# Altium footprint library Connector_PinHeader_1.27mm.PcbLib: 278 footprints (part 5 of 18) (continued)
## PinHeader_1x19_P1.27mm_Horizontal [mm] (continued)
  text "'.Designator'" at 1.504,-13.858 h0.6

## PinHeader_1x19_P1.27mm_Vertical [mm]
pads (19):
  rect 1x1 hole 0.65: 1(0,0)
  rrect100% 1x1 hole 0.65: 2(0,-1.27) 3(0,-2.54) 4(0,-3.81) 5(0,-5.08) 6(0,-6.35) 7(0,-7.62) 8(0,-8.89) 9(0,-10.16) 10(0,-11.43) 11(0,-12.7) 12(0,-13.97) 13(0,-15.24) 14(0,-16.51) 15(0,-17.78) 16(0,-19.05) 17(0,-20.32) 18(0,-21.59) 19(0,-22.86)
F.SilkS:
  lines w0.12: -1.11,0 -1.11,0.76 0,0.76 ; -0.563,-0.76 -1.11,-0.76 -1.11,-23.555 -0.308,-23.555 ; 0.308,-23.555 1.11,-23.555 1.11,-0.76 0.563,-0.76
F.CrtYd:
  lines w0.05: -1.55,-24 -1.55,1.15 1.55,1.15 1.55,-24 -1.55,-24
F.Fab:
  lines w0.1: -1.05,-23.495 -1.05,0.11 -0.525,0.635 1.05,0.635 1.05,-23.495 -1.05,-23.495
  text "'.Designator'" at 0.84,-15.477 h1

## PinHeader_1x19_P1.27mm_Vertical_SMD_Pin1Left [mm]
pads (19):
  rect 3x0.65 smd: 1(-1.5,11.43) 2(1.5,10.16) 3(-1.5,8.89) 4(1.5,7.62) 5(-1.5,6.35) 6(1.5,5.08) 7(-1.5,3.81) 8(1.5,2.54) 9(-1.5,1.27) 10(1.5,0) 11(-1.5,-1.27) 12(1.5,-2.54) 13(-1.5,-3.81) 14(1.5,-5.08) 15(-1.5,-6.35) 16(1.5,-7.62) 17(-1.5,-8.89) 18(1.5,-10.16) 19(-1.5,-11.43)
F.SilkS:
  lines w0.12: -2.94,12.015 -1.11,12.015 -1.11,12.125 1.11,12.125 ; -1.11,-12.125 1.11,-12.125 1.11,-12.015 ; -1.11,-10.845 -1.11,-9.475 ; -1.11,-8.305 -1.11,-6.935 ; -1.11,-5.765 -1.11,-4.395 ; -1.11,-3.225 -1.11,-1.855 ; -1.11,-0.685 -1.11,0.685 ; -1.11,1.855 -1.11,3.225 ; -1.11,4.395 -1.11,5.765 ; -1.11,6.935 -1.11,8.305 ; -1.11,9.475 -1.11,10.845 ; 1.11,-12.115 1.11,-10.745 ; 1.11,-9.575 1.11,-8.205 ; 1.11,-7.035 1.11,-5.665 ; 1.11,-4.495 1.11,-3.125 ; 1.11,-1.955 1.11,-0.585 ; 1.11,0.585 1.11,1.955 ; 1.11,3.125 1.11,4.495 ; 1.11,5.665 1.11,7.035 ; 1.11,8.205 1.11,9.575 ; 1.11,10.745 1.11,12.115
F.CrtYd:
  lines w0.05: -3.5,-12.6 3.5,-12.6 3.5,12.6 -3.5,12.6 -3.5,-12.6
F.Fab:
  lines w0.1: -1.05,-11.63 -2.5,-11.63 -2.5,-11.23 -1.05,-11.23 ; -1.05,-9.09 -2.5,-9.09 -2.5,-8.69 -1.05,-8.69 ; -1.05,-6.55 -2.5,-6.55 -2.5,-6.15 -1.05,-6.15 ; -1.05,-4.01 -2.5,-4.01 -2.5,-3.61 -1.05,-3.61 ; -1.05,-1.47 -2.5,-1.47 -2.5,-1.07 -1.05,-1.07 ; -1.05,1.07 -2.5,1.07 -2.5,1.47 -1.05,1.47 ; -1.05,3.61 -2.5,3.61 -2.5,4.01 -1.05,4.01 ; -1.05,6.15 -2.5,6.15 -2.5,6.55 -1.05,6.55 ; -1.05,8.69 -2.5,8.69 -2.5,9.09 -1.05,9.09 ; -1.05,11.23 -2.5,11.23 -2.5,11.63 -1.05,11.63 ; 1.05,-10.36 2.5,-10.36 2.5,-9.96 1.05,-9.96 ; 1.05,-7.82 2.5,-7.82 2.5,-7.42 1.05,-7.42 ; 1.05,-5.28 2.5,-5.28 2.5,-4.88 1.05,-4.88 ; 1.05,-2.74 2.5,-2.74 2.5,-2.34 1.05,-2.34 ; 1.05,-0.2 2.5,-0.2 2.5,0.2 1.05,0.2 ; 1.05,2.34 2.5,2.34 2.5,2.74 1.05,2.74 ; 1.05,4.88 2.5,4.88 2.5,5.28 1.05,5.28 ; 1.05,7.42 2.5,7.42 2.5,7.82 1.05,7.82 ; 1.05,9.96 2.5,9.96 2.5,10.36 1.05,10.36 ; -1.05,11.63 -0.615,12.065 1.05,12.065 1.05,-12.065 -1.05,-12.065 -1.05,11.63
  text "'.Designator'" at 0.84,-4.047 h1

## PinHeader_1x19_P1.27mm_Vertical_SMD_Pin1Right [mm]
pads (19):
  rect 3x0.65 smd: 1(1.5,11.43) 2(-1.5,10.16) 3(1.5,8.89) 4(-1.5,7.62) 5(1.5,6.35) 6(-1.5,5.08) 7(1.5,3.81) 8(-1.5,2.54) 9(1.5,1.27) 10(-1.5,0) 11(1.5,-1.27) 12(-1.5,-2.54) 13(1.5,-3.81) 14(-1.5,-5.08) 15(1.5,-6.35) 16(-1.5,-7.62) 17(1.5,-8.89) 18(-1.5,-10.16) 19(1.5,-11.43)
F.SilkS:
  lines w0.12: -1.11,-12.115 -1.11,-10.745 ; -1.11,-12.015 -1.11,-12.125 1.11,-12.125 ; -1.11,-9.575 -1.11,-8.205 ; -1.11,-7.035 -1.11,-5.665 ; -1.11,-4.495 -1.11,-3.125 ; -1.11,-1.955 -1.11,-0.585 ; -1.11,0.585 -1.11,1.955 ; -1.11,3.125 -1.11,4.495 ; -1.11,5.665 -1.11,7.035 ; -1.11,8.205 -1.11,9.575 ; -1.11,10.745 -1.11,12.115 ; -1.11,12.125 1.11,12.125 1.11,12.015 2.94,12.015 ; 1.11,-10.845 1.11,-9.475 ; 1.11,-8.305 1.11,-6.935 ; 1.11,-5.765 1.11,-4.395 ; 1.11,-3.225 1.11,-1.855 ; 1.11,-0.685 1.11,0.685 ; 1.11,1.855 1.11,3.225 ; 1.11,4.395 1.11,5.765 ; 1.11,6.935 1.11,8.305 ; 1.11,9.475 1.11,10.845
F.CrtYd:
  lines w0.05: -3.5,-12.6 -3.5,12.6 3.5,12.6 3.5,-12.6 -3.5,-12.6
F.Fab:
  lines w0.1: -1.05,-10.36 -2.5,-10.36 -2.5,-9.96 -1.05,-9.96 ; -1.05,-7.82 -2.5,-7.82 -2.5,-7.42 -1.05,-7.42 ; -1.05,-5.28 -2.5,-5.28 -2.5,-4.88 -1.05,-4.88 ; -1.05,-2.74 -2.5,-2.74 -2.5,-2.34 -1.05,-2.34 ; -1.05,-0.2 -2.5,-0.2 -2.5,0.2 -1.05,0.2 ; -1.05,2.34 -2.5,2.34 -2.5,2.74 -1.05,2.74 ; -1.05,4.88 -2.5,4.88 -2.5,5.28 -1.05,5.28 ; -1.05,7.42 -2.5,7.42 -2.5,7.82 -1.05,7.82 ; -1.05,9.96 -2.5,9.96 -2.5,10.36 -1.05,10.36 ; 1.05,-11.63 2.5,-11.63 2.5,-11.23 1.05,-11.23 ; 1.05,-9.09 2.5,-9.09 2.5,-8.69 1.05,-8.69 ; 1.05,-6.55 2.5,-6.55 2.5,-6.15 1.05,-6.15 ; 1.05,-4.01 2.5,-4.01 2.5,-3.61 1.05,-3.61 ; 1.05,-1.47 2.5,-1.47 2.5,-1.07 1.05,-1.07 ; 1.05,1.07 2.5,1.07 2.5,1.47 1.05,1.47 ; 1.05,3.61 2.5,3.61 2.5,4.01 1.05,4.01 ; 1.05,6.15 2.5,6.15 2.5,6.55 1.05,6.55 ; 1.05,8.69 2.5,8.69 2.5,9.09 1.05,9.09 ; 1.05,11.23 2.5,11.23 2.5,11.63 1.05,11.63 ; 1.05,11.63 0.615,12.065 -1.05,12.065 -1.05,-12.065 1.05,-12.065 1.05,11.63
  text "'.Designator'" at 0.84,-4.047 h1

## PinHeader_1x20_P1.27mm_Horizontal [mm]
pads (20):
  rect 1x1 hole 0.65: 1(0,0)
  rrect100% 1x1 hole 0.65: 2(0,-1.27) 3(0,-2.54) 4(0,-3.81) 5(0,-5.08) 6(0,-6.35) 7(0,-7.62) 8(0,-8.89) 9(0,-10.16) 10(0,-11.43) 11(0,-12.7) 12(0,-13.97) 13(0,-15.24) 14(0,-16.51) 15(0,-17.78) 16(0,-19.05) 17(0,-20.32) 18(0,-21.59) 19(0,-22.86) 20(0,-24.13)
F.SilkS:
  lines w0.12: -0.76,0 -0.76,0.76 0,0.76 ; 0.44,-24.75 0.44,-24.825 1.56,-24.825 1.56,0.695 0.76,0.695 ; 0.44,-23.51 0.44,-23.48 ; 0.44,-23.495 1.56,-23.495 ; 0.44,-22.24 0.44,-22.21 ; 0.44,-22.225 1.56,-22.225 ; 0.44,-20.97 0.44,-20.94 ; 0.44,-20.955 1.56,-20.955 ; 0.44,-19.7 0.44,-19.67 ; 0.44,-19.685 1.56,-19.685 ; 0.44,-18.43 0.44,-18.4 ; 0.44,-18.415 1.56,-18.415 ; 0.44,-17.16 0.44,-17.13 ; 0.44,-17.145 1.56,-17.145 ; 0.44,-15.89 0.44,-15.86 ; 0.44,-15.875 1.56,-15.875 ; 0.44,-14.62 0.44,-14.59 ; 0.44,-14.605 1.56,-14.605 ; 0.44,-13.35 0.44,-13.32 ; 0.44,-13.335 1.56,-13.335 ; 0.44,-12.08 0.44,-12.05 ; 0.44,-12.065 1.56,-12.065 ; 0.44,-10.81 0.44,-10.78 ; 0.44,-10.795 1.56,-10.795 ; 0.44,-9.54 0.44,-9.51 ; 0.44,-9.525 1.56,-9.525 ; 0.44,-8.27 0.44,-8.24 ; 0.44,-8.255 1.56,-8.255 ; 0.44,-7 0.44,-6.97 ; 0.44,-6.985 1.56,-6.985 ; 0.44,-5.73 0.44,-5.7 ; 0.44,-5.715 1.56,-5.715 ; 0.44,-4.46 0.44,-4.43 ; 0.44,-4.445 1.56,-4.445 ; 0.44,-3.19 0.44,-3.16 ; 0.44,-3.175 1.56,-3.175 ; 0.44,-1.92 0.44,-1.89 ; 0.44,-1.905 1.56,-1.905 ; 0.76,-0.635 1.56,-0.635 ; 1.56,-24.39 5.56,-24.39 5.56,-23.87 1.56,-23.87 ; 1.56,-23.12 5.56,-23.12 5.56,-22.6 1.56,-22.6 ; 1.56,-21.85 5.56,-21.85 5.56,-21.33 1.56,-21.33 ; 1.56,-20.58 5.56,-20.58 5.56,-20.06 1.56,-20.06 ; 1.56,-19.31 5.56,-19.31 5.56,-18.79 1.56,-18.79 ; 1.56,-18.04 5.56,-18.04 5.56,-17.52 1.56,-17.52 ; 1.56,-16.77 5.56,-16.77 5.56,-16.25 1.56,-16.25 ; 1.56,-15.5 5.56,-15.5 5.56,-14.98 1.56,-14.98 ; 1.56,-14.23 5.56,-14.23 5.56,-13.71 1.56,-13.71 ; 1.56,-12.96 5.56,-12.96 5.56,-12.44 1.56,-12.44 ; 1.56,-11.69 5.56,-11.69 5.56,-11.17 1.56,-11.17 ; 1.56,-10.42 5.56,-10.42 5.56,-9.9 1.56,-9.9 ; 1.56,-9.15 5.56,-9.15 5.56,-8.63 1.56,-8.63 ; 1.56,-7.88 5.56,-7.88 5.56,-7.36 1.56,-7.36 ; 1.56,-6.61 5.56,-6.61 5.56,-6.09 1.56,-6.09 ; 1.56,-5.34 5.56,-5.34 5.56,-4.82 1.56,-4.82 ; 1.56,-4.07 5.56,-4.07 5.56,-3.55 1.56,-3.55 ; 1.56,-2.8 5.56,-2.8 5.56,-2.28 1.56,-2.28 ; 1.56,-1.53 5.56,-1.53 5.56,-1.01 1.56,-1.01 ; 1.56,-0.26 5.56,-0.26 5.56,0.26 1.56,0.26 ; 1.56,-0.16 5.56,-0.16 ; 1.56,-0.04 5.56,-0.04 ; 1.56,0.08 5.56,0.08 ; 1.56,0.2 5.56,0.2
F.CrtYd:
  lines w0.05: -1.15,-25.3 6,-25.3 6,1.15 -1.15,1.15 -1.15,-25.3
F.Fab:
  lines w0.1: 0.5,-24.33 -0.2,-24.33 -0.2,-23.93 0.5,-23.93 ; 0.5,-23.06 -0.2,-23.06 -0.2,-22.66 0.5,-22.66 ; 0.5,-21.79 -0.2,-21.79 -0.2,-21.39 0.5,-21.39 ; 0.5,-20.52 -0.2,-20.52 -0.2,-20.12 0.5,-20.12 ; 0.5,-19.25 -0.2,-19.25 -0.2,-18.85 0.5,-18.85 ; 0.5,-17.98 -0.2,-17.98 -0.2,-17.58 0.5,-17.58 ; 0.5,-16.71 -0.2,-16.71 -0.2,-16.31 0.5,-16.31 ; 0.5,-15.44 -0.2,-15.44 -0.2,-15.04 0.5,-15.04 ; 0.5,-14.17 -0.2,-14.17 -0.2,-13.77 0.5,-13.77 ; 0.5,-12.9 -0.2,-12.9 -0.2,-12.5 0.5,-12.5 ; 0.5,-11.63 -0.2,-11.63 -0.2,-11.23 0.5,-11.23 ; 0.5,-10.36 -0.2,-10.36 -0.2,-9.96 0.5,-9.96 ; 0.5,-9.09 -0.2,-9.09 -0.2,-8.69 0.5,-8.69 ; 0.5,-7.82 -0.2,-7.82 -0.2,-7.42 0.5,-7.42 ; 0.5,-6.55 -0.2,-6.55 -0.2,-6.15 0.5,-6.15 ; 0.5,-5.28 -0.2,-5.28 -0.2,-4.88 0.5,-4.88 ; 0.5,-4.01 -0.2,-4.01 -0.2,-3.61 0.5,-3.61 ; 0.5,-2.74 -0.2,-2.74 -0.2,-2.34 0.5,-2.34 ; 0.5,-1.47 -0.2,-1.47 -0.2,-1.07 0.5,-1.07 ; 0.5,-0.2 -0.2,-0.2 -0.2,0.2 0.5,0.2 ; 1.5,-24.33 5.5,-24.33 5.5,-23.93 1.5,-23.93 ; 1.5,-23.06 5.5,-23.06 5.5,-22.66 1.5,-22.66 ; 1.5,-21.79 5.5,-21.79 5.5,-21.39 1.5,-21.39 ; 1.5,-20.52 5.5,-20.52 5.5,-20.12 1.5,-20.12 ; 1.5,-19.25 5.5,-19.25 5.5,-18.85 1.5,-18.85 ; 1.5,-17.98 5.5,-17.98 5.5,-17.58 1.5,-17.58 ; 1.5,-16.71 5.5,-16.71 5.5,-16.31 1.5,-16.31 ; 1.5,-15.44 5.5,-15.44 5.5,-15.04 1.5,-15.04 ; 1.5,-14.17 5.5,-14.17 5.5,-13.77 1.5,-13.77 ; 1.5,-12.9 5.5,-12.9 5.5,-12.5 1.5,-12.5 ; 1.5,-11.63 5.5,-11.63 5.5,-11.23 1.5,-11.23 ; 1.5,-10.36 5.5,-10.36 5.5,-9.96 1.5,-9.96 ; 1.5,-9.09 5.5,-9.09 5.5,-8.69 1.5,-8.69 ; 1.5,-7.82 5.5,-7.82 5.5,-7.42 1.5,-7.42 ; 1.5,-6.55 5.5,-6.55 5.5,-6.15 1.5,-6.15 ; 1.5,-5.28 5.5,-5.28 5.5,-4.88 1.5,-4.88 ; 1.5,-4.01 5.5,-4.01 5.5,-3.61 1.5,-3.61 ; 1.5,-2.74 5.5,-2.74 5.5,-2.34 1.5,-2.34 ; 1.5,-1.47 5.5,-1.47 5.5,-1.07 1.5,-1.07 ; 1.5,-0.2 5.5,-0.2 5.5,0.2 1.5,0.2 ; 0.5,-24.765 1.5,-24.765 1.5,0.635 0.75,0.635 0.5,0.385 0.5,-24.765
  text "'.Designator'" at 1.504,-14.493 h0.6

## PinHeader_1x20_P1.27mm_Vertical [mm]
pads (20):
  rect 1x1 hole 0.65: 1(0,0)
  rrect100% 1x1 hole 0.65: 2(0,-1.27) 3(0,-2.54) 4(0,-3.81) 5(0,-5.08) 6(0,-6.35) 7(0,-7.62) 8(0,-8.89) 9(0,-10.16) 10(0,-11.43) 11(0,-12.7) 12(0,-13.97) 13(0,-15.24) 14(0,-16.51) 15(0,-17.78) 16(0,-19.05) 17(0,-20.32) 18(0,-21.59) 19(0,-22.86) 20(0,-24.13)
F.SilkS:
  lines w0.12: -1.11,0 -1.11,0.76 0,0.76 ; -0.563,-0.76 -1.11,-0.76 -1.11,-24.825 -0.308,-24.825 ; 0.308,-24.825 1.11,-24.825 1.11,-0.76 0.563,-0.76
F.CrtYd:
  lines w0.05: -1.55,-25.3 1.55,-25.3 1.55,1.15 -1.55,1.15 -1.55,-25.3
F.Fab:
  lines w0.1: -1.05,-24.765 -1.05,0.11 -0.525,0.635 1.05,0.635 1.05,-24.765 -1.05,-24.765
  text "'.Designator'" at 0.84,-16.112 h1

## PinHeader_1x20_P1.27mm_Vertical_SMD_Pin1Left [mm]
pads (20):
  rect 3x0.65 smd: 1(-1.5,12.065) 2(1.5,10.795) 3(-1.5,9.525) 4(1.5,8.255) 5(-1.5,6.985) 6(1.5,5.715) 7(-1.5,4.445) 8(1.5,3.175) 9(-1.5,1.905) 10(1.5,0.635) 11(-1.5,-0.635) 12(1.5,-1.905) 13(-1.5,-3.175) 14(1.5,-4.445) 15(-1.5,-5.715) 16(1.5,-6.985) 17(-1.5,-8.255) 18(1.5,-9.525) 19(-1.5,-10.795) 20(1.5,-12.065)
F.SilkS:
  lines w0.12: -2.94,12.65 -1.11,12.65 -1.11,12.76 1.11,12.76 ; -1.11,-12.76 1.11,-12.76 1.11,-12.65 ; -1.11,-12.75 -1.11,-11.38 ; -1.11,-10.21 -1.11,-8.84 ; -1.11,-7.67 -1.11,-6.3 ; -1.11,-5.13 -1.11,-3.76 ; -1.11,-2.59 -1.11,-1.22 ; -1.11,-0.05 -1.11,1.32 ; -1.11,2.49 -1.11,3.86 ; -1.11,5.03 -1.11,6.4 ; -1.11,7.57 -1.11,8.94 ; -1.11,10.11 -1.11,11.48 ; 1.11,-11.48 1.11,-10.11 ; 1.11,-8.94 1.11,-7.57 ; 1.11,-6.4 1.11,-5.03 ; 1.11,-3.86 1.11,-2.49 ; 1.11,-1.32 1.11,0.05 ; 1.11,1.22 1.11,2.59 ; 1.11,3.76 1.11,5.13 ; 1.11,6.3 1.11,7.67 ; 1.11,8.84 1.11,10.21 ; 1.11,11.38 1.11,12.75
F.CrtYd:
  lines w0.05: -3.5,-13.2 -3.5,13.2 3.5,13.2 3.5,-13.2 -3.5,-13.2
F.Fab:
  lines w0.1: -1.05,-10.995 -2.5,-10.995 -2.5,-10.595 -1.05,-10.595 ; -1.05,-8.455 -2.5,-8.455 -2.5,-8.055 -1.05,-8.055 ; -1.05,-5.915 -2.5,-5.915 -2.5,-5.515 -1.05,-5.515 ; -1.05,-3.375 -2.5,-3.375 -2.5,-2.975 -1.05,-2.975 ; -1.05,-0.835 -2.5,-0.835 -2.5,-0.435 -1.05,-0.435 ; -1.05,1.705 -2.5,1.705 -2.5,2.105 -1.05,2.105 ; -1.05,4.245 -2.5,4.245 -2.5,4.645 -1.05,4.645 ; -1.05,6.785 -2.5,6.785 -2.5,7.185 -1.05,7.185 ; -1.05,9.325 -2.5,9.325 -2.5,9.725 -1.05,9.725 ; -1.05,11.865 -2.5,11.865 -2.5,12.265 -1.05,12.265 ; 1.05,-12.265 2.5,-12.265 2.5,-11.865 1.05,-11.865 ; 1.05,-9.725 2.5,-9.725 2.5,-9.325 1.05,-9.325 ; 1.05,-7.185 2.5,-7.185 2.5,-6.785 1.05,-6.785 ; 1.05,-4.645 2.5,-4.645 2.5,-4.245 1.05,-4.245 ; 1.05,-2.105 2.5,-2.105 2.5,-1.705 1.05,-1.705 ; 1.05,0.435 2.5,0.435 2.5,0.835 1.05,0.835 ; 1.05,2.975 2.5,2.975 2.5,3.375 1.05,3.375 ; 1.05,5.515 2.5,5.515 2.5,5.915 1.05,5.915 ; 1.05,8.055 2.5,8.055 2.5,8.455 1.05,8.455 ; 1.05,10.595 2.5,10.595 2.5,10.995 1.05,10.995 ; -1.05,12.265 -0.615,12.7 1.05,12.7 1.05,-12.7 -1.05,-12.7 -1.05,12.265
  text "'.Designator'" at 0.84,-4.047 h1

## PinHeader_1x20_P1.27mm_Vertical_SMD_Pin1Right [mm]
pads (20):
  rect 3x0.65 smd: 1(1.5,12.065) 2(-1.5,10.795) 3(1.5,9.525) 4(-1.5,8.255) 5(1.5,6.985) 6(-1.5,5.715) 7(1.5,4.445) 8(-1.5,3.175) 9(1.5,1.905) 10(-1.5,0.635) 11(1.5,-0.635) 12(-1.5,-1.905) 13(1.5,-3.175) 14(-1.5,-4.445) 15(1.5,-5.715) 16(-1.5,-6.985) 17(1.5,-8.255) 18(-1.5,-9.525) 19(1.5,-10.795) 20(-1.5,-12.065)
F.SilkS:
  lines w0.12: -1.11,-12.65 -1.11,-12.76 1.11,-12.76 ; -1.11,-11.48 -1.11,-10.11 ; -1.11,-8.94 -1.11,-7.57 ; -1.11,-6.4 -1.11,-5.03 ; -1.11,-3.86 -1.11,-2.49 ; -1.11,-1.32 -1.11,0.05 ; -1.11,1.22 -1.11,2.59 ; -1.11,3.76 -1.11,5.13 ; -1.11,6.3 -1.11,7.67 ; -1.11,8.84 -1.11,10.21 ; -1.11,11.38 -1.11,12.75 ; -1.11,12.76 1.11,12.76 1.11,12.65 2.94,12.65 ; 1.11,-12.75 1.11,-11.38 ; 1.11,-10.21 1.11,-8.84 ; 1.11,-7.67 1.11,-6.3 ; 1.11,-5.13 1.11,-3.76 ; 1.11,-2.59 1.11,-1.22 ; 1.11,-0.05 1.11,1.32 ; 1.11,2.49 1.11,3.86 ; 1.11,5.03 1.11,6.4 ; 1.11,7.57 1.11,8.94 ; 1.11,10.11 1.11,11.48
F.CrtYd:
  lines w0.05: -3.5,-13.2 3.5,-13.2 3.5,13.2 -3.5,13.2 -3.5,-13.2
F.Fab:
  lines w0.1: -1.05,-12.265 -2.5,-12.265 -2.5,-11.865 -1.05,-11.865 ; -1.05,-9.725 -2.5,-9.725 -2.5,-9.325 -1.05,-9.325 ; -1.05,-7.185 -2.5,-7.185 -2.5,-6.785 -1.05,-6.785 ; -1.05,-4.645 -2.5,-4.645 -2.5,-4.245 -1.05,-4.245 ; -1.05,-2.105 -2.5,-2.105 -2.5,-1.705 -1.05,-1.705 ; -1.05,0.435 -2.5,0.435 -2.5,0.835 -1.05,0.835 ; -1.05,2.975 -2.5,2.975 -2.5,3.375 -1.05,3.375 ; -1.05,5.515 -2.5,5.515 -2.5,5.915 -1.05,5.915 ; -1.05,8.055 -2.5,8.055 -2.5,8.455 -1.05,8.455 ; -1.05,10.595 -2.5,10.595 -2.5,10.995 -1.05,10.995 ; 1.05,-10.995 2.5,-10.995 2.5,-10.595 1.05,-10.595 ; 1.05,-8.455 2.5,-8.455 2.5,-8.055 1.05,-8.055 ; 1.05,-5.915 2.5,-5.915 2.5,-5.515 1.05,-5.515 ; 1.05,-3.375 2.5,-3.375 2.5,-2.975 1.05,-2.975 ; 1.05,-0.835 2.5,-0.835 2.5,-0.435 1.05,-0.435 ; 1.05,1.705 2.5,1.705 2.5,2.105 1.05,2.105 ; 1.05,4.245 2.5,4.245 2.5,4.645 1.05,4.645 ; 1.05,6.785 2.5,6.785 2.5,7.185 1.05,7.185 ; 1.05,9.325 2.5,9.325 2.5,9.725 1.05,9.725 ; 1.05,11.865 2.5,11.865 2.5,12.265 1.05,12.265 ; 1.05,12.265 1.05,-12.7 -1.05,-12.7 -1.05,12.7 0.615,12.7 1.05,12.265
  text "'.Designator'" at 0.84,-4.047 h1

## PinHeader_1x21_P1.27mm_Horizontal [mm]
pads (21):
  rect 1x1 hole 0.65: 1(0,0)
  rrect100% 1x1 hole 0.65: 2(0,-1.27) 3(0,-2.54) 4(0,-3.81) 5(0,-5.08) 6(0,-6.35) 7(0,-7.62) 8(0,-8.89) 9(0,-10.16) 10(0,-11.43) 11(0,-12.7) 12(0,-13.97) 13(0,-15.24) 14(0,-16.51) 15(0,-17.78) 16(0,-19.05) 17(0,-20.32) 18(0,-21.59) 19(0,-22.86) 20(0,-24.13) 21(0,-25.4)
F.SilkS:
  lines w0.12: -0.76,0 -0.76,0.76 0,0.76 ; 0.44,-26.02 0.44,-26.095 1.56,-26.095 1.56,0.695 0.76,0.695 ; 0.44,-24.78 0.44,-24.75 ; 0.44,-24.765 1.56,-24.765 ; 0.44,-23.51 0.44,-23.48 ; 0.44,-23.495 1.56,-23.495 ; 0.44,-22.24 0.44,-22.21 ; 0.44,-22.225 1.56,-22.225 ; 0.44,-20.97 0.44,-20.94 ; 0.44,-20.955 1.56,-20.955 ; 0.44,-19.7 0.44,-19.67 ; 0.44,-19.685 1.56,-19.685 ; 0.44,-18.43 0.44,-18.4 ; 0.44,-18.415 1.56,-18.415 ; 0.44,-17.16 0.44,-17.13 ; 0.44,-17.145 1.56,-17.145 ; 0.44,-15.89 0.44,-15.86 ; 0.44,-15.875 1.56,-15.875 ; 0.44,-14.62 0.44,-14.59 ; 0.44,-14.605 1.56,-14.605 ; 0.44,-13.35 0.44,-13.32 ; 0.44,-13.335 1.56,-13.335 ; 0.44,-12.08 0.44,-12.05 ; 0.44,-12.065 1.56,-12.065 ; 0.44,-10.81 0.44,-10.78 ; 0.44,-10.795 1.56,-10.795 ; 0.44,-9.54 0.44,-9.51 ; 0.44,-9.525 1.56,-9.525 ; 0.44,-8.27 0.44,-8.24 ; 0.44,-8.255 1.56,-8.255 ; 0.44,-7 0.44,-6.97 ; 0.44,-6.985 1.56,-6.985 ; 0.44,-5.73 0.44,-5.7 ; 0.44,-5.715 1.56,-5.715 ; 0.44,-4.46 0.44,-4.43 ; 0.44,-4.445 1.56,-4.445 ; 0.44,-3.19 0.44,-3.16 ; 0.44,-3.175 1.56,-3.175 ; 0.44,-1.92 0.44,-1.89 ; 0.44,-1.905 1.56,-1.905 ; 0.76,-0.635 1.56,-0.635 ; 1.56,-25.66 5.56,-25.66 5.56,-25.14 1.56,-25.14 ; 1.56,-24.39 5.56,-24.39 5.56,-23.87 1.56,-23.87 ; 1.56,-23.12 5.56,-23.12 5.56,-22.6 1.56,-22.6 ; 1.56,-21.85 5.56,-21.85 5.56,-21.33 1.56,-21.33 ; 1.56,-20.58 5.56,-20.58 5.56,-20.06 1.56,-20.06 ; 1.56,-19.31 5.56,-19.31 5.56,-18.79 1.56,-18.79 ; 1.56,-18.04 5.56,-18.04 5.56,-17.52 1.56,-17.52 ; 1.56,-16.77 5.56,-16.77 5.56,-16.25 1.56,-16.25 ; 1.56,-15.5 5.56,-15.5 5.56,-14.98 1.56,-14.98 ; 1.56,-14.23 5.56,-14.23 5.56,-13.71 1.56,-13.71 ; 1.56,-12.96 5.56,-12.96 5.56,-12.44 1.56,-12.44 ; 1.56,-11.69 5.56,-11.69 5.56,-11.17 1.56,-11.17 ; 1.56,-10.42 5.56,-10.42 5.56,-9.9 1.56,-9.9 ; 1.56,-9.15 5.56,-9.15 5.56,-8.63 1.56,-8.63 ; 1.56,-7.88 5.56,-7.88 5.56,-7.36 1.56,-7.36 ; 1.56,-6.61 5.56,-6.61 5.56,-6.09 1.56,-6.09 ; 1.56,-5.34 5.56,-5.34 5.56,-4.82 1.56,-4.82 ; 1.56,-4.07 5.56,-4.07 5.56,-3.55 1.56,-3.55 ; 1.56,-2.8 5.56,-2.8 5.56,-2.28 1.56,-2.28 ; 1.56,-1.53 5.56,-1.53 5.56,-1.01 1.56,-1.01 ; 1.56,-0.26 5.56,-0.26 5.56,0.26 1.56,0.26 ; 1.56,-0.16 5.56,-0.16 ; 1.56,-0.04 5.56,-0.04 ; 1.56,0.08 5.56,0.08 ; 1.56,0.2 5.56,0.2
F.CrtYd:
  lines w0.05: -1.15,-26.55 -1.15,1.15 6,1.15 6,-26.55 -1.15,-26.55
F.Fab:
  lines w0.1: 0.5,-25.6 -0.2,-25.6 -0.2,-25.2 0.5,-25.2 ; 0.5,-24.33 -0.2,-24.33 -0.2,-23.93 0.5,-23.93 ; 0.5,-23.06 -0.2,-23.06 -0.2,-22.66 0.5,-22.66 ; 0.5,-21.79 -0.2,-21.79 -0.2,-21.39 0.5,-21.39 ; 0.5,-20.52 -0.2,-20.52 -0.2,-20.12 0.5,-20.12 ; 0.5,-19.25 -0.2,-19.25 -0.2,-18.85 0.5,-18.85 ; 0.5,-17.98 -0.2,-17.98 -0.2,-17.58 0.5,-17.58 ; 0.5,-16.71 -0.2,-16.71 -0.2,-16.31 0.5,-16.31 ; 0.5,-15.44 -0.2,-15.44 -0.2,-15.04 0.5,-15.04 ; 0.5,-14.17 -0.2,-14.17 -0.2,-13.77 0.5,-13.77 ; 0.5,-12.9 -0.2,-12.9 -0.2,-12.5 0.5,-12.5 ; 0.5,-11.63 -0.2,-11.63 -0.2,-11.23 0.5,-11.23 ; 0.5,-10.36 -0.2,-10.36 -0.2,-9.96 0.5,-9.96 ; 0.5,-9.09 -0.2,-9.09 -0.2,-8.69 0.5,-8.69 ; 0.5,-7.82 -0.2,-7.82 -0.2,-7.42 0.5,-7.42 ; 0.5,-6.55 -0.2,-6.55 -0.2,-6.15 0.5,-6.15 ; 0.5,-5.28 -0.2,-5.28 -0.2,-4.88 0.5,-4.88 ; 0.5,-4.01 -0.2,-4.01 -0.2,-3.61 0.5,-3.61 ; 0.5,-2.74 -0.2,-2.74 -0.2,-2.34 0.5,-2.34 ; 0.5,-1.47 -0.2,-1.47 -0.2,-1.07 0.5,-1.07 ; 0.5,-0.2 -0.2,-0.2 -0.2,0.2 0.5,0.2 ; 1.5,-25.6 5.5,-25.6 5.5,-25.2 1.5,-25.2 ; 1.5,-24.33 5.5,-24.33 5.5,-23.93 1.5,-23.93 ; 1.5,-23.06 5.5,-23.06 5.5,-22.66 1.5,-22.66 ; 1.5,-21.79 5.5,-21.79 5.5,-21.39 1.5,-21.39 ; 1.5,-20.52 5.5,-20.52 5.5,-20.12 1.5,-20.12 ; 1.5,-19.25 5.5,-19.25 5.5,-18.85 1.5,-18.85 ; 1.5,-17.98 5.5,-17.98 5.5,-17.58 1.5,-17.58 ; 1.5,-16.71 5.5,-16.71 5.5,-16.31 1.5,-16.31 ; 1.5,-15.44 5.5,-15.44 5.5,-15.04 1.5,-15.04 ; 1.5,-14.17 5.5,-14.17 5.5,-13.77 1.5,-13.77 ; 1.5,-12.9 5.5,-12.9 5.5,-12.5 1.5,-12.5 ; 1.5,-11.63 5.5,-11.63 5.5,-11.23 1.5,-11.23 ; 1.5,-10.36 5.5,-10.36 5.5,-9.96 1.5,-9.96 ; 1.5,-9.09 5.5,-9.09 5.5,-8.69 1.5,-8.69 ; 1.5,-7.82 5.5,-7.82 5.5,-7.42 1.5,-7.42 ; 1.5,-6.55 5.5,-6.55 5.5,-6.15 1.5,-6.15 ; 1.5,-5.28 5.5,-5.28 5.5,-4.88 1.5,-4.88 ; 1.5,-4.01 5.5,-4.01 5.5,-3.61 1.5,-3.61 ; 1.5,-2.74 5.5,-2.74 5.5,-2.34 1.5,-2.34 ; 1.5,-1.47 5.5,-1.47 5.5,-1.07 1.5,-1.07 ; 1.5,-0.2 5.5,-0.2 5.5,0.2 1.5,0.2 ; 0.5,-26.035 0.5,0.385 0.75,0.635 1.5,0.635 1.5,-26.035 0.5,-26.035
  text "'.Designator'" at 1.504,-15.128 h0.6

## PinHeader_1x21_P1.27mm_Vertical [mm]
pads (21):
  rect 1x1 hole 0.65: 1(0,0)
  rrect100% 1x1 hole 0.65: 2(0,-1.27) 3(0,-2.54) 4(0,-3.81) 5(0,-5.08) 6(0,-6.35) 7(0,-7.62) 8(0,-8.89) 9(0,-10.16) 10(0,-11.43) 11(0,-12.7) 12(0,-13.97) 13(0,-15.24) 14(0,-16.51) 15(0,-17.78) 16(0,-19.05) 17(0,-20.32) 18(0,-21.59) 19(0,-22.86) 20(0,-24.13) 21(0,-25.4)
F.SilkS:
  lines w0.12: -1.11,0 -1.11,0.76 0,0.76 ; -0.563,-0.76 -1.11,-0.76 -1.11,-26.095 -0.308,-26.095 ; 0.308,-26.095 1.11,-26.095 1.11,-0.76 0.563,-0.76
F.CrtYd:
  lines w0.05: -1.55,-26.55 1.55,-26.55 1.55,1.15 -1.55,1.15 -1.55,-26.55
F.Fab:
  lines w0.1: -1.05,-26.035 1.05,-26.035 1.05,0.635 -0.525,0.635 -1.05,0.11 -1.05,-26.035
  text "'.Designator'" at 0.84,-16.747 h1